# Altium footprint library XU-GENARAL PCB .PcbLib: 1176 footprints (part 75 of 75)
Each footprint in its own frame and in the unit in brackets; x right, y up, seen from the top. Pads: shape width x height; smd on the part's side, far side on the other; paste and mask are expansions set on the pad; w line width, h text height; cw(c..) or ccw(c..) is an arc to the next point about the centre after c.
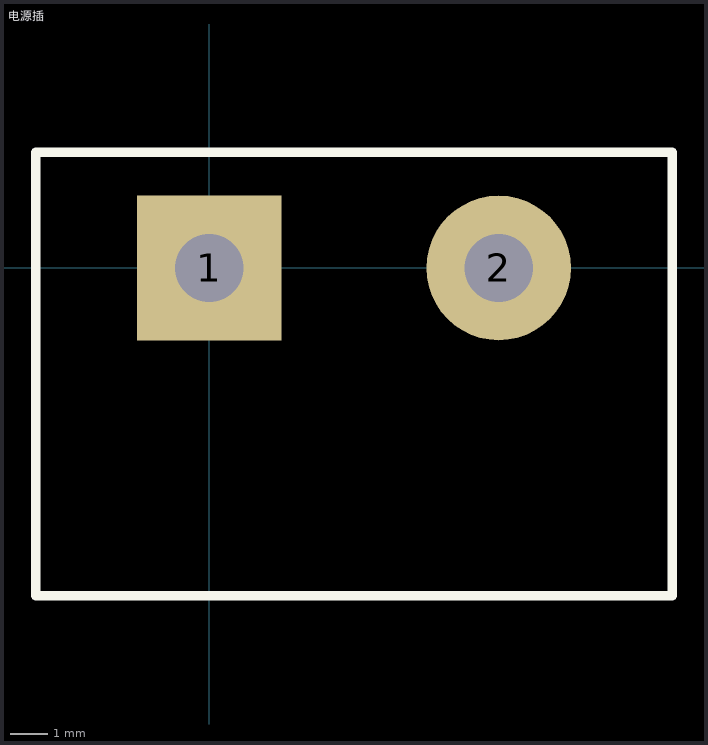
[diagram p74: the footprint, top view; thin cyan lines are the x and y axes]

## 电源插 [mm]
height 6.8
pads (2):
  rect 3.81x3.81 hole 1.8: 1(0,0)
  round 3.81 hole 1.8: 2(7.62,0)
Top Overlay:
  lines w0.254: -4.572,3.048 -4.572,-8.636 12.192,-8.636 12.192,3.048 ; -4.54,3.048 12.16,3.048